# Altium footprint library 集成IC.PcbLib: 51 footprints (part 4 of 4)
Each footprint in its own frame and in the unit in brackets; x right, y up, seen from the top. Pads: shape width x height; smd on the part's side, far side on the other; paste and mask are expansions set on the pad; w line width, h text height; cw(c..) or ccw(c..) is an arc to the next point about the centre after c.
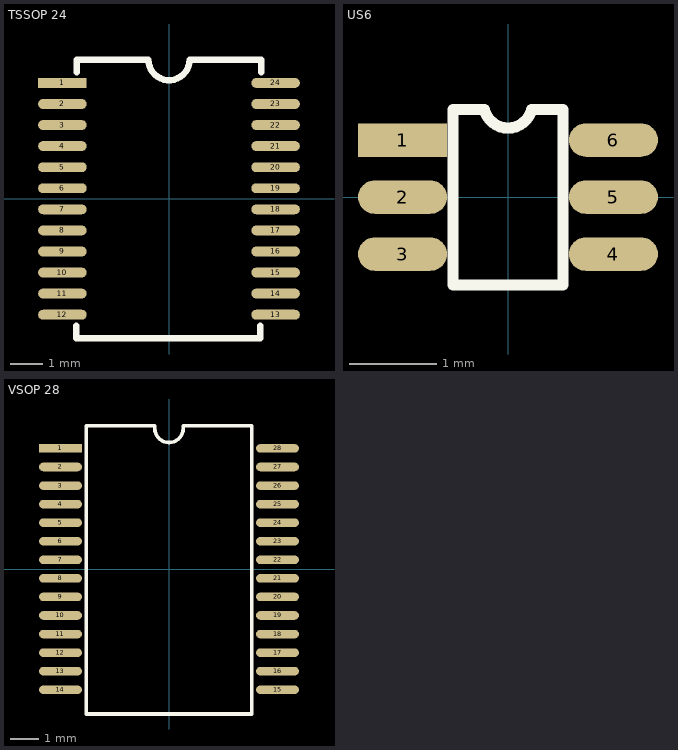
[diagram p3: the footprints below, top view; thin cyan lines are the x and y axes]

## TSSOP 24 [mm]
pads (24):
  rect 1.5x0.305 smd: 1(-3.288,3.575)
  oval 1.5x0.305 smd: 2(-3.288,2.925) 3(-3.288,2.275) 4(-3.288,1.625) 5(-3.288,0.975) 6(-3.288,0.325) 7(-3.288,-0.325) 8(-3.288,-0.975) 9(-3.288,-1.625) 10(-3.288,-2.275) 11(-3.288,-2.925) 12(-3.288,-3.575) 13(3.288,-3.575) 14(3.288,-2.925) 15(3.288,-2.275) 16(3.288,-1.625) 17(3.288,-0.975) 18(3.288,-0.325) 19(3.288,0.325) 20(3.288,0.975) 21(3.288,1.625) 22(3.288,2.275) 23(3.288,2.925) 24(3.288,3.575)
Top Overlay:
  lines w0.2: -2.864,-3.92 -2.864,-4.295 2.813,-4.295 2.813,-3.92 ; -2.839,3.902 -2.839,4.295 -0.635,4.295 ccw(c0,4.295) 0.635,4.295 ; 0.699,4.295 2.839,4.295 2.839,3.902
3D body "User Library-TSSOP-24.STEP": height 1.2, standoff 0, extent -3.2,-3.9 3.2,3.9

## US6 [mil]
pads (6):
  rect 40x15 smd: 1(-47.32,25.59)
  oval 40x15 smd: 2(-47.32,0) 3(-47.32,-25.59) 4(47.32,-25.59) 5(47.32,0) 6(47.32,25.59)
Top Overlay:
  lines w5: -24.61,-39.37 -24.61,39.37 -10.63,39.37 ccw(c0,41.93) 10.63,39.37 24.61,39.37 24.61,-39.37 -24.61,-39.37
3D body "User Library-TUMT6.step": height 33.31, standoff -0.94, extent -41.33,-40.37 41.35,38.37

## VSOP 28 [mm]
pads (28):
  rect 1.5x0.3 smd: 1(-3.8,4.225)
  oval 1.5x0.3 smd: 2(-3.8,3.575) 3(-3.8,2.925) 4(-3.8,2.275) 5(-3.8,1.625) 6(-3.8,0.975) 7(-3.8,0.325) 8(-3.8,-0.325) 9(-3.8,-0.975) 10(-3.8,-1.625) 11(-3.8,-2.275) 12(-3.8,-2.925) 13(-3.8,-3.575) 14(-3.8,-4.225) 15(3.8,-4.225) 16(3.8,-3.575) 17(3.8,-2.925) 18(3.8,-2.275) 19(3.8,-1.625) 20(3.8,-0.975) 21(3.8,-0.325) 22(3.8,0.325) 23(3.8,0.975) 24(3.8,1.625) 25(3.8,2.275) 26(3.8,2.925) 27(3.8,3.575) 28(3.8,4.225)
Top Overlay:
  lines w0.127: -2.9,-5.075 2.9,-5.075 2.9,5.025 2.6,5.025 0.5,5.025 0.5,4.925 cw(c0,4.931) -0.5,4.925 -0.5,5.025 -2.9,5.025 -2.9,-5.075
3D body "User Library-SSOP-28-1.step": height 2.15, standoff 0, extent -3.878,-5.165 3.878,5.165